# Altium footprint library surface.PcbLib: 97 footprints (part 4 of 7)
Each footprint in its own frame and in the unit in brackets; x right, y up, seen from the top. Pads: shape width x height; smd on the part's side, far side on the other; paste and mask are expansions set on the pad; w line width, h text height; cw(c..) or ccw(c..) is an arc to the next point about the centre after c.
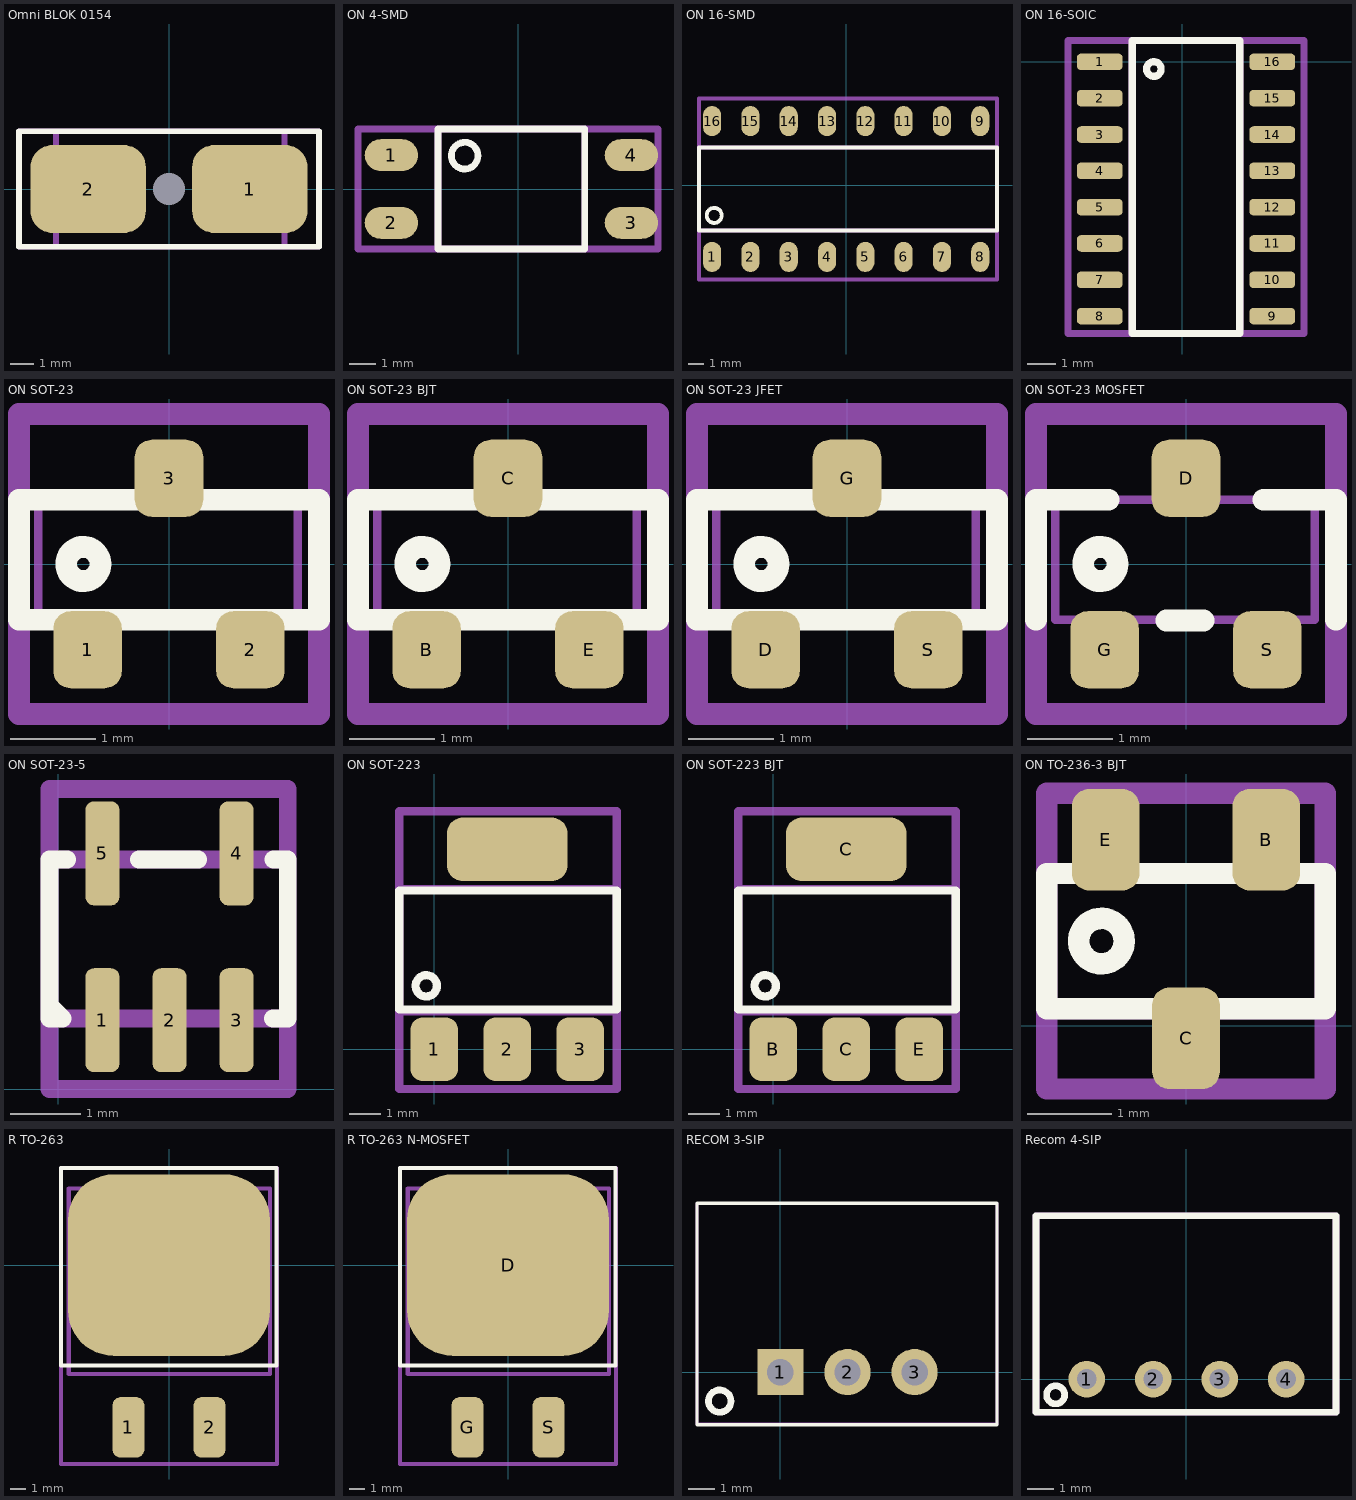
[diagram p3: the footprints below, top view; thin cyan lines are the x and y axes]

## Omni BLOK 0154 [mm]
pads (3):
  rrect50% 5x3.81 smd: 1(3.5,0) 2(-3.5,0)
  rect 0x0 hole 1.4 square unplated: 3(0,0)
Top Overlay:
  lines w0.254: -6.5,-2.5 -6.5,2.5 6.5,2.5 6.5,-2.5 -6.5,-2.5
Mechanical 13:
  lines w0.254: -4.9,-2.5 5,-2.5 5,2.5 -4.9,2.5 -4.9,-2.5
Mechanical 15:
  lines w0.25: -0.5,0 0.5,0 ; 0,-0.5 0,0.5
  lines w0.254: -6.5,-2.5 6.5,-2.5 6.5,2.5 -6.5,2.5 -6.5,-2.5
3D body "16 - Terminal Board Littelfuse 154.STEP": height 3.81, standoff 0, extent -4.926,-2.518 4.904,2.512

## ON 4-SMD [mm] "SOP, 4-Leads, Body 3.85x4.4mm, Pitch 2.54mm, IPC Medium Density"
height 2.1
pads (4):
  oval 2x1.2 smd: 1(-4.75,1.27) 2(-4.75,-1.27) 3(4.25,-1.27) 4(4.25,1.27)
Top Overlay:
  circle w0.254: c-2,1.25 r0.5
  lines w0.254: -3,-2.25 2.5,-2.25 2.5,2.25 -3,2.25 -3,-2.25
Mechanical 13:
  lines w0.254: -3,-2.25 2.5,-2.25 2.5,2.25 -3,2.25 -3,-2.25
Mechanical 15:
  lines w0.254: -6,-2.25 5.25,-2.25 5.25,2.25 -6,2.25 -6,-2.25
3D body "LTV-816S-TA1--3DModel-STEP-56544.STEP": height 4.6, standoff 0, extent -5.33,-2.3 4.83,2.3

## ON 16-SMD [mm]
pads (16):
  oval 1.2x2 smd: 1(-8.89,-4.75) 2(-6.35,-4.75) 3(-3.81,-4.75) 4(-1.27,-4.75) 5(1.27,-4.75) 6(3.81,-4.75) 7(6.35,-4.75) 8(8.89,-4.75) 9(8.89,4.25) 10(6.35,4.25) 11(3.81,4.25) 12(1.27,4.25) 13(-1.27,4.25) 14(-3.81,4.25) 15(-6.35,4.25) 16(-8.89,4.25)
Top Overlay:
  circle w0.254: c-8.75,-2 r0.5
  lines w0.254: -9.75,-3 10,-3 10,2.5 -9.75,2.5 -9.75,-3
Mechanical 13:
  lines w0.254: -9.75,-3 10,-3 10,2.5 -9.75,2.5 -9.75,-3
Mechanical 15:
  lines w0.254: -9.75,-6.25 10,-6.25 10,5.75 -9.75,5.75 -9.75,-6.25
3D body "LTV-846S--3DModel-STEP-56544.STEP": height 4.6, standoff 0, extent -10,-5.33 9.84,4.83

## ON 16-SOIC [mm]
pads (16):
  rrect50% 1.6x0.58 smd: 1(-2.89,0) 2(-2.89,-1.27) 3(-2.89,-2.54) 4(-2.89,-3.81) 5(-2.89,-5.08) 6(-2.89,-6.35) 7(-2.89,-7.62) 8(-2.89,-8.89) 9(3.14,-8.89) 10(3.14,-7.62) 11(3.14,-6.35) 12(3.14,-5.08) 13(3.14,-3.81) 14(3.14,-2.54) 15(3.14,-1.27) 16(3.14,0)
Top Overlay:
  circle w0.254: c-1,-0.25 r0.254
  lines w0.254: -1.75,-9.5 2,-9.5 2,0.75 -1.75,0.75 -1.75,-9.5
Mechanical 13:
  lines w0.254: -1.75,-9.5 -1.75,0.75 2,0.75 2,-9.5 -1.75,-9.5
Mechanical 15:
  lines w0.254: -4,-9.5 -4,0.75 4.25,0.75 4.25,-9.5 -4,-9.5
3D body "ON 16-SOIC.STEP": height 1.75, standoff 0, extent -3.086,-9.397 3.144,0.603

## ON SOT-23 [mm] "NUP2105L"
pads (3):
  rrect50% 0.8x0.9 smd: 1(-0.95,-1) 2(0.95,-1) 3(0,1)
Top Overlay:
  circle w0.254: c-1,0 r0.2
  lines w0.254: -1.75,0.75 -1.75,0.75 ; -1.75,0.75 -1.75,-0.65 1.75,-0.65 1.75,0.75 -1.75,0.75
Mechanical 13:
  lines w0.1: -1.525,-0.65 -1.525,0.75 1.5,0.75 1.5,-0.65 -1.525,-0.65
Mechanical 15:
  lines w0.254: -1.75,-1.75 -1.75,1.75 1.75,1.75 1.75,-1.75 -1.75,-1.75
3D body "SOT-23.STEP": height 1, standoff 0, extent -1.5,-1.275 1.5,1.275

## ON SOT-23 BJT [mm] "NUP2105L"
pads (3):
  rrect50% 0.8x0.9 smd: B(-0.95,-1) C(0,1) E(0.95,-1)
Top Overlay:
  circle w0.254: c-1,0 r0.2
  lines w0.254: -1.75,0.75 -1.75,0.75 ; -1.75,0.75 -1.75,-0.65 1.75,-0.65 1.75,0.75 -1.75,0.75
Mechanical 13:
  lines w0.1: -1.525,-0.65 -1.525,0.75 1.5,0.75 1.5,-0.65 -1.525,-0.65
Mechanical 15:
  lines w0.254: -1.75,-1.75 -1.75,1.75 1.75,1.75 1.75,-1.75 -1.75,-1.75
3D body "SOT-23.STEP": height 1, standoff 0, extent -1.5,-1.275 1.5,1.275

## ON SOT-23 JFET [mm] "NUP2105L"
pads (3):
  rrect50% 0.8x0.9 smd: D(-0.95,-1) G(0,1) S(0.95,-1)
Top Overlay:
  circle w0.254: c-1,0 r0.2
  lines w0.254: -1.75,0.75 1.75,0.75 1.75,-0.65 -1.75,-0.65 -1.75,0.75 ; -1.75,0.75 -1.75,0.75
Mechanical 13:
  lines w0.1: -1.525,-0.65 1.5,-0.65 1.5,0.75 -1.525,0.75 -1.525,-0.65
Mechanical 15:
  lines w0.254: -1.75,-1.75 1.75,-1.75 1.75,1.75 -1.75,1.75 -1.75,-1.75
3D body "SOT-23.STEP": height 1, standoff 0, extent -1.5,-1.275 1.5,1.275

## ON SOT-23 MOSFET [mm] "NUP2105L"
pads (3):
  rrect50% 0.8x0.9 smd: D(0,1) G(-0.95,-1) S(0.95,-1)
Top Overlay:
  circle w0.254: c-1,0 r0.2
  lines w0.254: -1.75,-0.65 -1.75,0.75 ; -0.901,0.75 -1.75,0.75 ; -0.229,-0.66 0.203,-0.66 ; 0.901,0.75 1.75,0.75 1.75,-0.65 ; -1.75,0.75 -1.75,0.75
Mechanical 13:
  lines w0.1: -1.525,-0.65 1.5,-0.65 1.5,0.75 -1.525,0.75 -1.525,-0.65
Mechanical 15:
  lines w0.254: -1.75,-1.75 1.75,-1.75 1.75,1.75 -1.75,1.75 -1.75,-1.75
3D body "SOT-23.STEP": height 1, standoff 0, extent -1.5,-1.275 1.5,1.275

## ON SOT-23-5 [mil]
pads (5):
  rrect50% 19x58 smd: 1(24.61,38.39) 2(62.01,38.39) 3(99.41,38.39) 4(99.41,131.39) 5(24.61,131.39)
Top Overlay:
  lines w10: -5,46.74 2.37,39.37 -4.92,39.37 -4.92,127.95 4.95,127.95 ; 45,128 78,128 ; 119.63,39.37 127.95,39.37 127.95,127.95 120.05,127.95
Mechanical 13:
  lines w10: -4.92,39.37 127.95,39.37 127.95,127.95 -4.92,127.95 -4.92,39.37
Mechanical 15:
  lines w10: -4.92,0 -4.92,167.32 127.95,167.32 127.95,0 -4.92,0
3D body "DBV5.step": height 57.09, standoff 0, extent 2.01,26.62 122.01,144.65

## ON SOT-223 [mm]
pads (4):
  rrect50% 1.5x2 smd: 1(0,0) 2(2.3,0) 3(4.6,0)
  rrect50% 3.8x2 smd: ""(2.3,6.3)
Top Overlay:
  circle w0.254: c-0.25,2 r0.335
  lines w0.254: -1.1,1.25 5.75,1.25 5.75,5 -1.1,5 -1.1,1.25
Mechanical 13:
  lines w0.254: -1.1,-1.25 5.75,-1.25 5.75,7.5 -1.1,7.5 -1.1,-1.25
Mechanical 15:
  lines w0.254: -1.1,1.2 -1.1,4.3 -1.1,5.05 5.75,5.05 5.75,1.2 -1.1,1.2
3D body "SOT223-3.step": height 1.6, standoff 0, extent -0.925,-0.437 5.575,6.637

## ON SOT-223 BJT [mm]
pads (4):
  rrect50% 1.5x2 smd: B(0,0) C(2.3,0) E(4.6,0)
  rrect50% 3.8x2 smd: C(2.3,6.3)
Top Overlay:
  circle w0.254: c-0.25,2 r0.335
  lines w0.254: -1.1,1.25 -1.1,5 5.75,5 5.75,1.25 -1.1,1.25
Mechanical 13:
  lines w0.254: -1.1,-1.25 -1.1,7.5 5.75,7.5 5.75,-1.25 -1.1,-1.25
Mechanical 15:
  lines w0.254: -1.1,1.2 5.75,1.2 5.75,5.05 -1.1,5.05 -1.1,4.3 -1.1,1.2
3D body "SOT223-3.step": height 1.6, standoff 0, extent -0.925,-0.437 5.575,6.637

## ON TO-236-3 BJT [mm]
pads (3):
  rrect50% 0.8x1.2 smd: B(0.95,2.2) C(0,-0.15) E(-0.95,2.2)
Top Overlay:
  circle w0.254: c-1,1 r0.269
  lines w0.254: -1.65,0.2 -1.65,0.9 -1.65,1.8 1.65,1.8 1.65,0.2 -1.65,0.2
Mechanical 13:
  lines w0.254: -1.65,0.2 -1.65,1.8 1.65,1.8 1.65,0.2 -1.65,0.2
Mechanical 15:
  lines w0.254: -1.65,-0.75 1.65,-0.75 1.65,2.75 -1.65,2.75 -1.65,-0.75
3D body "Package, SOT-23.STEP": height 1, standoff 0, extent -1.45,-0.35 1.45,2.25

## R TO-263 [mm]
pads (3):
  rrect50% 2x3.8 smd: 1(-2.55,-10.2) 2(2.55,-10.2)
  rrect50% 12.7x11.4 smd: ""(0,0)
Top Overlay:
  lines w0.254: -6.8,-6.3 6.75,-6.3 6.75,6.1 -6.8,6.1 -6.8,-6.3
Mechanical 13:
  lines w0.254: -6.3,-6.85 -0.4,-6.85 6.35,-6.85 6.35,4.8 -6.3,4.8 -6.3,-6.85
Mechanical 15:
  lines w0.254: -6.8,-12.5 -6.8,6.1 6.8,6.1 6.8,-12.5 -6.8,-12.5
3D body "TO-263AB.stp": height 4.8, standoff 0, extent -5.193,-11.025 5.45,4.825

## R TO-263 N-MOSFET [mm]
pads (3):
  rrect50% 12.7x11.4 smd: D(0,0)
  rrect50% 2x3.8 smd: G(-2.55,-10.2) S(2.55,-10.2)
Top Overlay:
  lines w0.254: -6.8,-6.3 6.75,-6.3 6.75,6.1 -6.8,6.1 -6.8,-6.3
Mechanical 13:
  lines w0.254: -6.3,-6.85 -0.4,-6.85 6.35,-6.85 6.35,4.8 -6.3,4.8 -6.3,-6.85
Mechanical 15:
  lines w0.254: -6.8,-12.5 -6.8,6.1 6.8,6.1 6.8,-12.5 -6.8,-12.5
3D body "TRANS_R5009FNJ.step": height 4.7, standoff -0.05, extent -5.03,-9.639 5.08,4.559

## RECOM 3-SIP [mm] "12 to 42 Vdc In, 9 Vdc Out"
height 8.5
pads (3):
  rect 1.75x1.75 hole 1: 1(0,0)
  round 1.75 hole 1: 2(2.54,0) 3(5.08,0)
Top Overlay:
  circle w0.254: c-2.3,-1.1 r0.424
  lines w0.127: -3.16,-2 8.2,-2 8.2,6.4 -3.16,6.4 -3.16,-2
Mechanical 13:
  lines w0.1: -3.16,-1.975 -3.16,6.4 8.2,6.4 8.2,-1.975 -3.16,-1.975
Mechanical 15:
  lines w0.1: -3.16,-1.96 -3.16,6.4 8.2,6.4 8.2,-1.96 -3.16,-1.96
3D body "R-78Cx-1.0.STEP": height 12.94, standoff -3.59, extent -3.26,-2.032 8.34,6.468

## Recom 4-SIP [mil]
pads (4):
  round 55 hole 30: 1(-150,0) 2(-50,0) 3(50,0) 4(150,0)
Top Overlay:
  circle w10: c-196.85,-23.62 r13.64
  lines w10: -226.38,-50 -226.38,246.06 225,246.06 225,-50 -226.38,-50
Mechanical 13:
  lines w10: -226.38,-50 -226.38,246.06 225,246.06 225,-50 -226.38,-50
Mechanical 15:
  lines w10: -226.38,-50 -226.38,246.06 225,246.06 225,-50 -226.38,-50
3D body "ridc-dc.SLDPRT": height 401.97, standoff -161.42, extent -226.37,-51.18 226.38,248.04